# Altium footprint library USB.PcbLib: 23 footprints (part 1 of 2)
Each footprint in its own frame and in the unit in brackets; x right, y up, seen from the top. Pads: shape width x height; smd on the part's side, far side on the other; paste and mask are expansions set on the pad; w line width, h text height; cw(c..) or ccw(c..) is an arc to the next point about the centre after c.
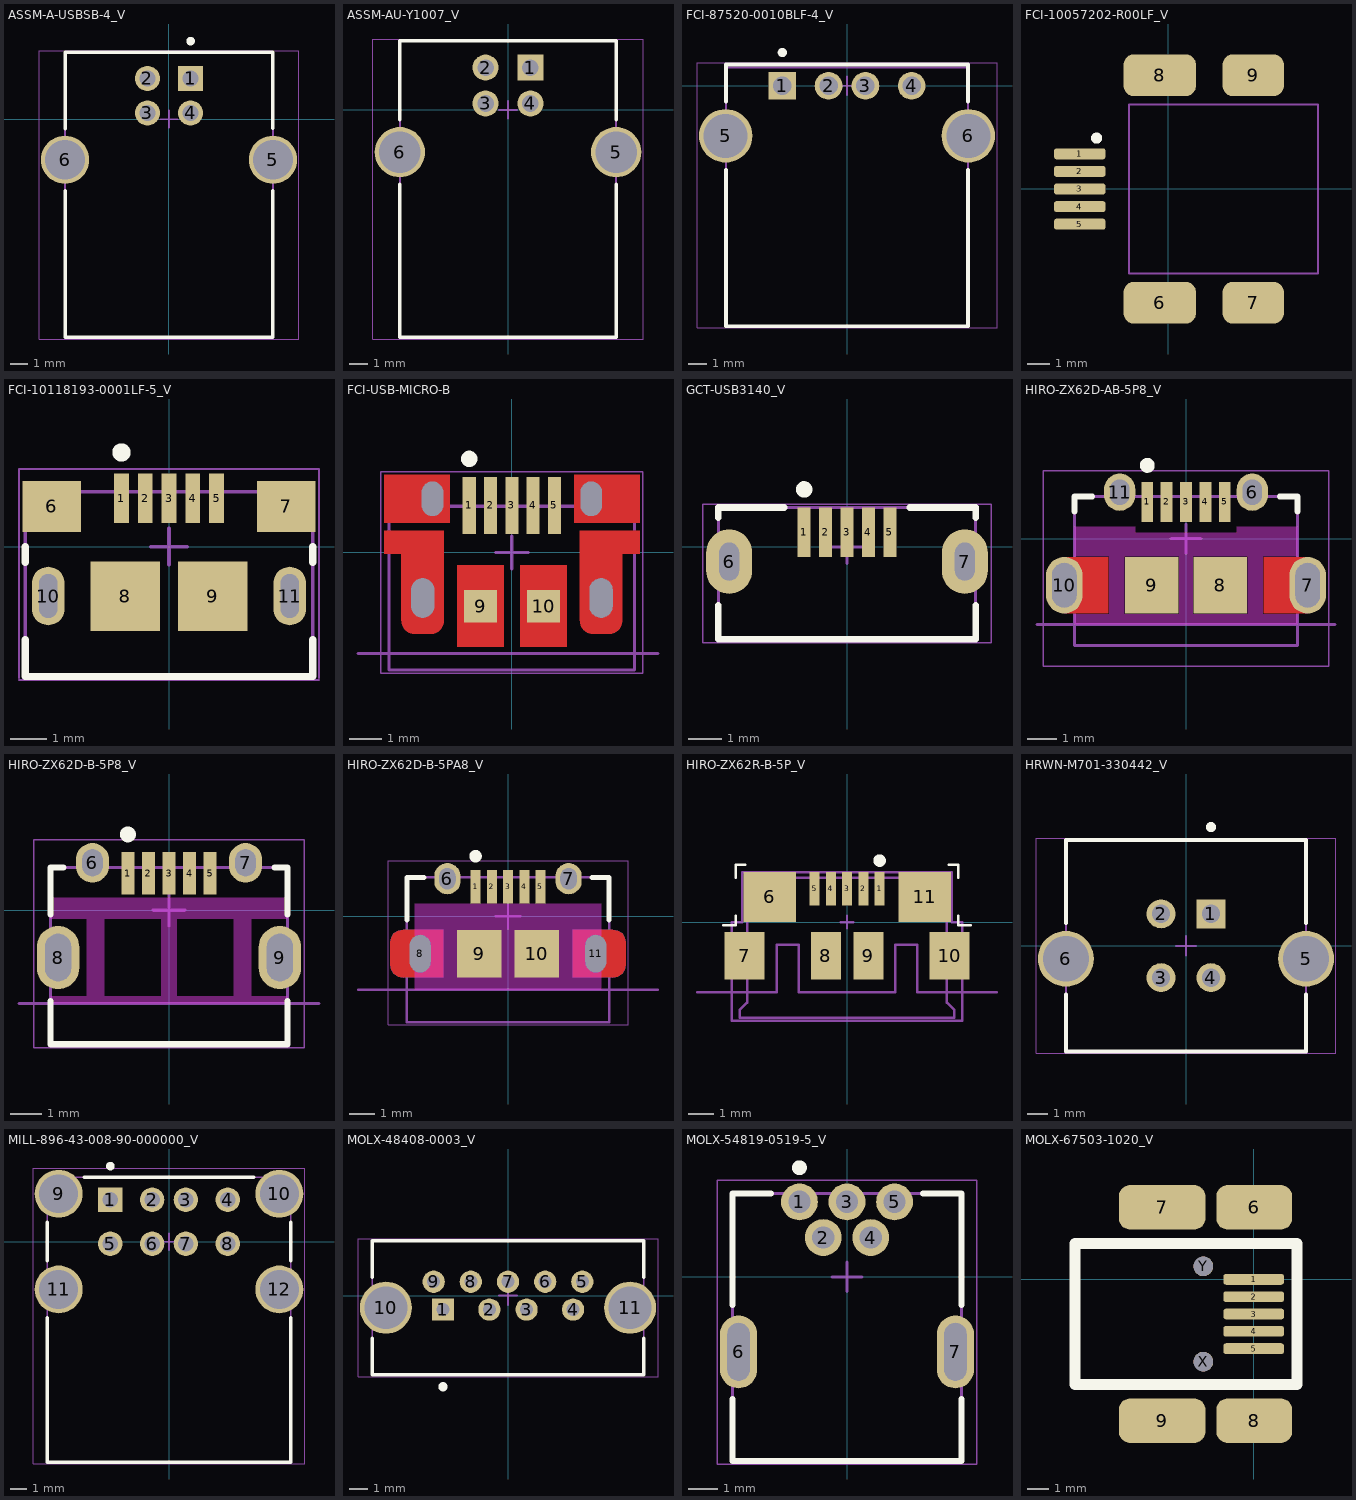
[diagram p0: the footprints below, top view; thin cyan lines are the x and y axes]

## ASSM-A-USBSB-4_V [mm] "USB-B, 4-Leads, Body 16.5x12.04mm"
height 11.05
pads (6):
  rect 1.45x1.45 hole 0.92: 1(1.25,2.355)
  round 1.45 hole 0.92: 2(-1.25,2.355) 3(-1.25,0.355) 4(1.25,0.355)
  round 2.8 hole 2.3: 5(6.02,-2.355) 6(-6.02,-2.355)
Top Overlay:
  circle w0.25: c1.25,4.515 r0.125
  lines w0.2: -6.02,-4.155 -6.02,-12.635 6.02,-12.635 6.02,-4.155 ; -6.02,-0.555 -6.02,3.865 6.02,3.865 6.02,-0.535
Mechanical 13:
  lines w0.1: -6.02,-12.635 6.02,-12.635 6.02,3.865 -6.02,3.865 -6.02,-12.635
Mechanical 15:
  lines w0.05: -7.52,-12.735 -7.52,3.965 7.52,3.965 7.52,-12.735 -7.52,-12.735
  lines w0.1: -0.5,0 0.5,0 ; 0,-0.5 0,0.5
3D body: height 11.05, standoff 0, extent -6.02,-12.635 6.02,3.865

## ASSM-AU-Y1007_V [mm] "USB Connector, 4-Leads, Body 16.5x12.04mm"
height 10.9
pads (6):
  rect 1.45x1.45 hole 0.92: 1(1.25,2.355)
  round 1.45 hole 0.92: 2(-1.25,2.355) 3(-1.25,0.355) 4(1.25,0.355)
  round 2.8 hole 2.3: 5(6.02,-2.355) 6(-6.02,-2.355)
Top Overlay:
  lines w0.2: -6.02,-4.155 -6.02,-12.655 6.02,-12.655 6.02,-4.155 ; -6.02,-0.555 -6.02,3.845 6.02,3.845 6.02,-0.555
Mechanical 13:
  lines w0.1: -6.02,-12.655 -6.02,3.845 6.02,3.845 6.02,-12.655 -6.02,-12.655
Mechanical 15:
  lines w0.05: -7.52,-12.755 7.52,-12.755 7.52,3.945 -7.52,3.945 -7.52,-12.755
  lines w0.1: -0.5,0 0.5,0 ; 0,-0.5 0,0.5
3D body: height 11.7, standoff -3.72, extent -7.195,-12.625 7.195,3.075

## FCI-87520-0010BLF-4_V [mm] "USB-A, 4-Leads, Body 14x13.1mm"
height 7
pads (6):
  rect 1.5x1.5 hole 1: 1(-3.5,0)
  round 1.5 hole 1: 2(-1,0) 3(1,0) 4(3.5,0)
  round 2.9 hole 2.38: 5(-6.57,-2.71) 6(6.57,-2.71)
Top Overlay:
  circle w0.25: c-3.5,1.8 r0.125
  lines w0.2: -6.55,-4.56 -6.55,-13.01 6.55,-13.01 6.55,-4.56 ; -6.55,-0.86 -6.55,1.15 6.55,1.15 6.55,-0.86
Mechanical 13:
  lines w0.1: -6.55,-13.01 -6.55,0.99 6.55,0.99 6.55,-13.01 -6.55,-13.01
Mechanical 15:
  lines w0.05: -8.12,-13.1 -8.12,1.25 8.12,1.25 8.12,-13.1 -8.12,-13.1
  lines w0.1: -0.5,0 0.5,0 ; 0,-0.5 0,0.5
3D body: height 7, standoff 0, extent -6.55,-13.01 6.55,0.99

## FCI-10057202-R00LF_V [mm] "Connector, USB Mini-B, Sinking Type, SMT, 5 Position, Right Angle"
height 0.35
pads (9):
  rrect50% 2.35x0.5 smd paste+0.038 mask+0.038: 1(-4.03,1.6) 2(-4.03,0.8) 3(-4.03,0)
  rrect50% 2.35x0.5 smd paste+0.038 mask+0: 4(-4.03,-0.8) 5(-4.03,-1.6)
  rrect50% 3.302x1.905 smd paste+0.038 mask+0: 6(-0.387,-5.175) 8(-0.387,5.175)
  rrect50% 2.794x1.905 smd paste+0.038 mask+0: 7(3.863,-5.175) 9(3.863,5.175)
Top Overlay:
  circle w0.25: c-3.263,2.314 r0.125
Mechanical 13:
  lines w0.1: -1.788,-3.85 -1.788,3.85 6.813,3.85 6.813,-3.85 -1.788,-3.85
3D body: height 1.41, standoff -2.35, extent -4.212,-5.9 6.858,5.9

## FCI-10118193-0001LF-5_V [mm] "Micro, USB-B, 5-Leads, Body 7.86x5.05mm, Pitch 0.65 mm"
pads (11):
  rect 0.4x1.35 smd: 1(-1.3,1.325) 2(-0.65,1.325) 3(0,1.325) 4(0.65,1.325) 5(1.3,1.325)
  rect 1.6x1.4 smd: 6(-3.2,1.1) 7(3.2,1.1)
  rect 1.9x1.9 smd: 8(-1.2,-1.35) 9(1.2,-1.35)
  oval 0.9x1.6 hole 0.5 slot 1.2 at 90 deg: 10(-3.3,-1.35) 11(3.3,-1.35)
Top Overlay:
  circle w0.25: c-1.3,2.575 r0.125
  lines w0.2: -3.93,-2.537 -3.93,-3.55 3.93,-3.55 3.93,-2.537 ; -3.93,-0.428 -3.93,0 ; 3.93,-0.428 3.93,0
Mechanical 13:
  lines w0.1: -3.93,-3.55 -3.93,1.5 3.93,1.5 3.93,-3.55 -3.93,-3.55
Mechanical 15:
  lines w0.05: -4.1,-3.65 4.1,-3.65 ; -4.1,-3.6 -4.1,2.125 4.1,2.125 4.1,-3.6
  lines w0.1: -0.5,0 0.5,0 ; 0,-0.5 0,0.5
3D body: height 2.83, standoff -0.77, extent -3.928,-4.16 3.929,1.5

## FCI-USB-MICRO-B [mm] "USB, MICRO B, Pitch 0.65 mm"
height 2.673
pads (11):
  rect 0.4x1.75 smd: 1(-1.3,1.435) 2(-0.65,1.435) 3(0,1.435) 4(0.65,1.435) 5(1.3,1.435)
  round 0 hole 0.65 slot 1.05 at 90 deg: 6(-2.425,1.64) 7(2.425,1.64)
  rrect50% 0x0 hole 0.7 slot 1.2 at 90 deg: 8(-2.725,-1.39) 11(2.725,-1.39)
  rect 1x1 smd: 9(-0.957,-1.64) 10(0.968,-1.64)
Top Layer:
  circle w0.4: c2.975,-2.09 r0.2
  circle w0.4: c2.475,-2.09 r0.2
  circle w0.4: c-2.975,-2.09 r0.2
  circle w0.4: c-2.475,-2.09 r0.2
  rectangle: 2.475,-2.49 2.975,-2.09
  rectangle: 0.255,-2.89 1.68,-0.39
  rectangle: -1.67,-2.89 -0.245,-0.39
  rectangle: -2.975,-2.09 -2.475,-2.09
  rectangle: -2.975,-2.49 -2.475,-2.09
  region: 1.9,2.37 3.9,2.37 3.9,0.91 1.9,0.91
  region: -3.375,-2.09 -3.375,-0.04 -3.9,-0.04 -3.9,0.66 -2.075,0.66 -2.075,-2.09
  region: 2.075,-2.09 2.075,0.66 3.9,0.66 3.9,-0.04 3.375,-0.04 3.375,-2.09
  region: -3.9,2.37 -1.9,2.37 -1.9,0.91 -3.9,0.91
Top Overlay:
  circle w0.25: c-1.3,2.86 r0.125
Mechanical 6:
  lines w0.1: -4.7,-3.09 4.465,-3.09
  text "PCB EDGE" at -7.225,-3.14 h0.3
Mechanical 13:
  lines w0.1: -3.75,-3.59 -3.75,1.41 3.75,1.41 3.75,-3.59 -3.75,-3.59
Mechanical 15:
  lines w0.05: -4,-3.69 -4,2.47 4,2.47 4,-3.69 -4,-3.69
  lines w0.1: -0.5,0 0.5,0 ; 0,-0.5 0,0.5
3D body: height 2.99, standoff 0, extent -3.75,-3.59 3.75,1.41

## GCT-USB3140_V [mm] "USB, Micro B, Body 7.8x4mm, Pitch 0.65mm"
height 6.5
pads (7):
  rect 0.4x1.5 smd: 1(-1.3,0.445) 2(-0.65,0.445) 3(0,0.445) 4(0.65,0.445) 5(1.3,0.445)
  oval 1.4x1.95 hole 0.6 slot 1.15 at 90 deg: 6(-3.575,-0.445) 7(3.575,-0.445)
Top Overlay:
  circle w0.25: c-1.3,1.745 r0.125
  lines w0.2: -3.9,-1.771 -3.9,-2.805 3.9,-2.805 3.9,-1.771 ; -3.9,0.881 -3.9,1.195 -1.9,1.195 ; 1.9,1.195 3.9,1.195 3.9,0.881
Mechanical 13:
  lines w0.1: -3.9,-2.805 -3.9,1.195 3.9,1.195 3.9,-2.805 -3.9,-2.805
Mechanical 15:
  lines w0.05: -4.375,-2.905 4.375,-2.905 4.375,1.295 -4.375,1.295 -4.375,-2.905
  lines w0.1: -0.5,0 0.5,0 ; 0,-0.5 0,0.5
3D body: height 6.55, standoff -2.25, extent -3.9,-2.805 3.902,1.195

## HIRO-ZX62D-AB-5P8_V [mm] "USB Micro-AB Connector, 5-Leads, Pitch 0.65mm"
height 2.8
pads (11):
  rect 0.4x1.35 smd: 1(-1.3,1.238) 2(-0.65,1.238) 3(0,1.238) 4(0.65,1.238) 5(1.3,1.238)
  oval 1.05x1.25 hole 0.65 slot 0.85 at 90 deg: 6(2.225,1.563) 11(-2.225,1.563)
  oval 1.225x1.9 hole 0.825 slot 1.5 at 90 deg: 7(4.088,-1.562) 10(-4.088,-1.562)
  rect 1.8x1.9 smd: 8(1.15,-1.562) 9(-1.15,-1.562)
Top Layer:
  rectangle: 2.6,-2.512 4.088,-0.612
  rectangle: -4.088,-2.512 -2.6,-0.612
Top Layer keep-out:
  rectangle: -3.75,-0.602 -1.7,0.413
  rectangle: -1.7,-0.602 1.7,0.213
  rectangle: 1.7,-0.602 3.75,0.413
  rectangle: -3.75,-2.887 3.75,-2.522
  rectangle: -2.59,-2.522 -2.06,-0.602
  rectangle: -0.24,-2.522 0.24,-0.602
  region: 2.59,-0.602 2.06,-0.602 2.06,-2.522 2.59,-2.522
Top Overlay:
  circle w0.25: c-1.3,2.463 r0.125
  lines w0.2: -3.75,0.91 -3.75,1.412 -3.149,1.412 ; 3.149,1.412 3.75,1.412 3.75,0.91
Mechanical 3:
  lines w0.1: -5,-2.887 5,-2.887
  text "board edge" at -7.112,-2.921 h0.2
Mechanical 13:
  lines w0.1: -3.75,-3.588 3.75,-3.587 3.75,1.413 -3.75,1.413 -3.75,-3.588
Mechanical 15:
  lines w0.05: -4.8,2.288 4.8,2.288 4.8,-4.286 -4.8,-4.286 -4.8,2.288
  lines w0.1: -0.5,0 0.5,0 ; 0,-0.5 0,0.5
3D body: height 2.5, standoff 2.25, extent -0.967,1.262 0.972,1.862
3D body: height 2.25, standoff -0.85, extent -2.379,1.262 2.387,1.863
3D body: height 0.25, standoff 0, extent -0.8,0.542 -0.493,1.685
3D body: height 0.25, standoff 0, extent -1.45,0.542 -1.143,1.685
3D body: height 0.25, standoff 0, extent 1.15,0.542 1.457,1.685
3D body: height 0.25, standoff 0, extent 0.5,0.542 0.807,1.685
3D body: height 0.25, standoff 0, extent -0.15,0.542 0.157,1.685
3D body: height 2.51, standoff -0.01, extent -3.756,-3.587 3.757,0.213
3D body: height 0.55, standoff -0.6, extent -4.373,-1.916 -3.603,-1.066
3D body: height 0.55, standoff -0.6, extent 3.603,-1.916 4.373,-1.065
3D body: height 2.5, standoff -0.01, extent -3.754,0.213 3.757,1.413
3D body: height 0.25, standoff 0, extent -3.25,0.212 3.25,0.543
3D body: height 1.79, standoff 0.71, extent -4,-4.187 -3.5,-3.586
3D body: height 1.79, standoff 0.71, extent 3.5,-4.187 4,-3.586
3D body: height 0.25, standoff -0.32, extent -3.05,-4.186 3.05,-3.586
3D body: height 2.83, standoff 2.25, extent -3.05,-4.186 3.05,-3.586

## HIRO-ZX62D-B-5P8_V [mm] "Micro-USB Connector, 9-Leads, Body 7.5x5.6mm, Pitch 0.65mm"
height 2.65
pads (9):
  rect 0.4x1.35 smd: 1(-1.3,1.175) 2(-0.65,1.175) 3(0,1.175) 4(0.65,1.175) 5(1.3,1.175)
  oval 1.05x1.25 hole 0.65 slot 0.85 at 90 deg: 6(-2.425,1.5) 7(2.425,1.5)
  oval 1.35x2 hole 0.825 slot 1.5 at 90 deg: 8(-3.512,-1.5) 9(3.512,-1.5)
Top Layer keep-out:
  region: 2.55,-2 2.1,-2 2.1,-1 2.55,-1
  region: -2.55,-2 -2.1,-2 -2.1,-1 -2.55,-1
  region: -0.18,-1.8 -0.18,-1 0.18,-1 0.18,-1.8
  region: -3.75,-2.725 -2.6,-2.725 -2.6,-1.5 -2.05,-1.5 -2.05,-2.725 -0.25,-2.725 -0.25,-1.5 0.25,-1.5 0.25,-2.725 2.05,-2.725 2.05,-1.5 2.6,-1.5 2.6,-2.725 3.75,-2.725 3.75,-2.95 -3.75,-2.95
  region: -2.6,-1.5 -2.05,-1.5 -2.05,-0.275 -0.25,-0.275 -0.25,-1.5 0.25,-1.5 0.25,-0.275 2.05,-0.275 2.05,-1.5 2.6,-1.5 2.6,-0.275 3.75,-0.275 3.75,0.395 -3.75,0.395 -3.75,-0.275 -2.6,-0.275
Top Overlay:
  circle w0.25: c-1.3,2.4 r0.125
  lines w0.2: -3.75,-2.873 -3.75,-4.25 3.75,-4.25 3.75,-2.873 ; -3.75,-0.127 -3.75,1.35 -3.349,1.35 ; 3.349,1.35 3.75,1.35 3.75,-0.127
Mechanical 1:
  lines w0.1: -4.75,-2.95 4.75,-2.95
  text "Board Edge" at -1.568,-3.405 h0.3
Mechanical 13:
  lines w0.1: -3.75,-4.25 3.75,-4.25 3.75,-2.95 3.75,1.35 -3.75,1.35 -3.75,-2.95 -3.75,-4.25
Mechanical 15:
  lines w0.05: -4.287,-4.35 4.287,-4.35 4.287,2.225 -4.287,2.225 -4.287,-4.35
  lines w0.1: -0.5,0 0.5,0 ; 0,-0.5 0,0.5
3D body: height 2.75, standoff -0.75, extent -4.047,-4.149 4.047,1.651

## HIRO-ZX62D-B-5PA8_V [mm] "SMD, 5-Leads, Body 7.5x5mm, Pitch 0.65mm"
height 2.8
pads (11):
  rect 0.4x1.35 smd: 1(-1.3,1.175) 2(-0.65,1.175) 3(0,1.175) 4(0.65,1.175) 5(1.3,1.175)
  oval 1.05x1.25 hole 0.65 slot 0.85 at 90 deg: 6(-2.425,1.5) 7(2.425,1.5)
  oval 0.525x1.2 hole 0.825 slot 1.5 at 90 deg: 8(-3.512,-1.5) 11(3.512,-1.5)
  rect 1.8x1.9 smd: 9(-1.15,-1.5) 10(1.15,-1.5)
Top Layer:
  region: -4.2,-2.46 -4.395,-2.421 -4.56,-2.31 -4.671,-2.145 -4.71,-1.95 -4.7,-1.95 -4.71,-1.05 -4.671,-0.855 -4.56,-0.69 -4.395,-0.579 -4.2,-0.54 -4.2,-0.55 -2.6,-0.55 -2.6,-2.45
  region: 4.2,-2.46 4.395,-2.421 4.56,-2.31 4.671,-2.145 4.71,-1.95 4.7,-1.95 4.71,-1.05 4.671,-0.855 4.56,-0.69 4.395,-0.579 4.2,-0.54 4.2,-0.55 2.6,-0.55 2.6,-2.45
Top Layer keep-out:
  rectangle: -3.75,-2.95 3.75,0.5
Bottom Layer:
  region: -4.2,-2.46 -4.395,-2.421 -4.56,-2.31 -4.671,-2.145 -4.71,-1.95 -4.7,-1.95 -4.71,-1.05 -4.671,-0.855 -4.56,-0.69 -4.395,-0.579 -4.2,-0.54 -4.2,-0.55 -2.6,-0.55 -2.6,-2.45
  region: 4.2,-2.46 4.395,-2.421 4.56,-2.31 4.671,-2.145 4.71,-1.95 4.7,-1.95 4.71,-1.05 4.671,-0.855 4.56,-0.69 4.395,-0.579 4.2,-0.54 4.2,-0.55 2.6,-0.55 2.6,-2.45
Top Overlay:
  circle w0.25: c-1.3,2.4 r0.125
  lines w0.2: -4.047,-0.15 -4.047,1.55 -3.35,1.55 ; 3.35,1.55 4.047,1.55 4.047,-0.15
Top Paste:
  region: 2.96,1.4 2.92,1.195 2.804,1.021 2.63,0.905 2.425,0.865 2.22,0.905 2.046,1.021 1.93,1.195 1.89,1.4 1.9,1.4 1.89,1.6 1.93,1.805 2.046,1.979 2.22,2.095 2.425,2.135 2.63,2.095 2.804,1.979 2.92,1.805 2.96,1.6 2.95,1.6
  region: -2.96,1.4 -2.92,1.195 -2.804,1.021 -2.63,0.905 -2.425,0.865 -2.22,0.905 -2.046,1.021 -1.93,1.195 -1.89,1.4 -1.9,1.4 -1.89,1.6 -1.93,1.805 -2.046,1.979 -2.22,2.095 -2.425,2.135 -2.63,2.095 -2.804,1.979 -2.92,1.805 -2.96,1.6 -2.95,1.6
Mechanical 1:
  lines w0.1: -6,-2.95 -5.4,-2.95 -5.1,-2.95 -5,-2.95 6,-2.95
  text "PCB EDGE" at 5.8,-2.4 h1
Mechanical 13:
  lines w0.1: -4.047,-4.25 -4.047,1.55 4.047,1.55 4.047,-4.25 -4.047,-4.25
Mechanical 15:
  lines w0.05: -4.8,-4.35 4.8,-4.35 4.8,2.225 -4.8,2.225 -4.8,-4.35
  lines w0.1: -0.5,0 0.5,0 ; 0,-0.5 0,0.5
3D body: height 2.75, standoff -0.7, extent -4.047,-4.25 4.047,1.55

## HIRO-ZX62R-B-5P_V [mm] "USB Micro-B R/A Connector"
height 2.65
pads (11):
  rect 0.4x1.35 smd: 1(1.3,1.338) 2(0.65,1.338) 3(0,1.338) 4(-0.65,1.338) 5(-1.3,1.338)
  rect 2.1x2 smd: 6(-3.1,1.012) 11(3.1,1.012)
  rect 1.6x1.9 smd: 7(-4.1,-1.338) 10(4.1,-1.338)
  rect 1.2x1.9 smd: 8(-0.85,-1.338) 9(0.85,-1.338)
Top Overlay:
  circle w0.25: c1.304,2.46 r0.125
  lines w0.1: -4.953,-0.127 -4.445,-0.127 -4.445,0.254 ; -4.445,1.778 -4.445,2.286 -4.064,2.286 ; 4.064,2.286 4.445,2.286 4.445,1.778 ; 4.445,0.254 4.445,-0.127 4.953,-0.127
Mechanical 1:
  lines w0.1: -6,-2.8 -2.82,-2.8 -2.82,-0.9 -1.92,-0.9 -1.92,-2.8 0,-2.8 1.92,-2.8 1.92,-0.9 2.82,-0.9 2.82,-2.8 6,-2.8
  text "Board edge" at 5.588,-2.667 h0.2
Mechanical 13:
  lines w0.1: -4,1.78 -4,-0.72 -4.572,-0.72 -4.572,-1.778 -4,-1.778 -4,-3.22 -4.3,-3.52 -4.3,-3.82 4.3,-3.82 4.3,-3.52 4,-3.22 4,-1.778 4.572,-1.778 4.572,-0.72 4,-0.72 4,1.78 ; -4,1.78 4,1.78 ; -4,1.78 4,1.78
Mechanical 15:
  lines w0.1: -0.254,0 0.254,0 ; 0,-0.254 0,0.254 ; -4.6,-3.937 -4.6,-2.8 -4.6,0 -4.2,0 -4.2,2 4.2,2 4.2,0 4.6,0 4.6,-2.8 4.6,-3.937 -4.6,-3.937
3D body: height 2.71, standoff -0.23, extent -4.4,-3.953 4.4,1.778

## HRWN-M701-330442_V [mm] "USB, 4-Leads, Body 12.04x10.6mm, Pitch 2.5mm"
height 16.25
pads (6):
  rect 1.45x1.45 hole 0.92: 1(1.25,1.6)
  round 1.45 hole 0.92: 2(-1.25,1.6) 3(-1.25,-1.6) 4(1.25,-1.6)
  round 2.8 hole 2.3: 5(6.02,-0.65) 6(-6.02,-0.65)
Top Overlay:
  circle w0.25: c1.25,5.952 r0.127
  lines w0.2: -6.02,-2.45 -6.02,-5.3 6.02,-5.3 6.02,-2.45 ; -6.02,1.15 -6.02,5.3 6.02,5.3 6.02,1.15
Mechanical 13:
  lines w0.1: -6.02,-5.3 -6.02,5.3 6.02,5.3 6.02,-5.3 -6.02,-5.3
Mechanical 15:
  lines w0.05: -7.52,-5.4 -7.52,5.4 7.52,5.4 7.52,-5.4 -7.52,-5.4
  lines w0.1: -0.5,0 0.5,0 ; 0,-0.5 0,0.5
3D body: height 16.5, standoff -5.1, extent -7.33,-5.715 7.33,4.985

## MILL-896-43-008-90-000000_V [mil] "USB, 8-Leads, Body 16.967x14.503mm"
height 610
pads (12):
  rect 57.09x57.09 hole 36: 1(-137.5,98)
  round 57.09 hole 36: 2(-39.5,98) 3(39.5,98) 4(137.5,98) 5(-137.5,-5) 6(-39.5,-5) 7(39.5,-5) 8(137.5,-5)
  round 112.2 hole 91: 9(-258.5,112) 10(258.5,112) 11(-258.5,-112) 12(258.5,-112)
Top Overlay:
  circle w10: c-137.5,176.74 r5
  lines w7.87: -285.5,-178.57 -285.5,-517 285.5,-517 285.5,-178.57 ; -285.5,-45.43 -285.5,45.43 ; -198.15,151 198.15,151 ; 285.5,-45.43 285.5,45.43
Mechanical 13:
  lines w3.94: -285.5,-517 -285.5,151 285.5,151 285.5,-517 -285.5,-517
Mechanical 15:
  lines w1.97: -318.54,-520.94 318.54,-520.94 318.54,172.05 -318.54,172.05 -318.54,-520.94
  lines w3.94: -19.68,0 19.68,0 ; 0,-19.68 0,19.68
3D body: height 610, standoff 0, extent -285.5,-517 285.5,151

## MOLX-48408-0003_V [mm] "USB 3.0 I/O Receptacle, 9-Leads, Vertical, Height 15.25 mm, Through Hole"
height 15.25
pads (11):
  rect 1.2x1.2 hole 0.7: 1(-3.5,-0.75)
  round 1.2 hole 0.7: 2(-1,-0.75) 3(1,-0.75) 4(3.5,-0.75) 5(4,0.75) 6(2,0.75) 7(0,0.75) 8(-2,0.75) 9(-4,0.75)
  round 2.8 hole 2.3 unplated: 10(-6.57,-0.65) 11(6.57,-0.65)
Top Overlay:
  circle w0.25: c-3.5,-4.9 r0.125
  lines w0.2: -7.3,-2.295 -7.3,-4.25 7.3,-4.25 7.3,-2.295 ; -7.3,0.995 -7.3,2.95 7.3,2.95 7.3,0.995
Mechanical 13:
  lines w0.1: -7.3,-4.25 -7.3,2.95 7.3,2.95 7.3,-4.25 -7.3,-4.25
Mechanical 15:
  lines w0.05: -8.07,-4.35 8.07,-4.35 8.07,3.05 -8.07,3.05 -8.07,-4.35
  lines w0.1: -0.5,0 0.5,0 ; 0,-0.5 0,0.5
3D body: height 15, standoff -3.8, extent -7.798,-4.11 7.798,2.81

## MOLX-54819-0519-5_V [mm] "MINI USB, 5-Leads, Body 9x7.7mm, Pitch 0.8mm"
height 3.95
pads (7):
  round 1.24 hole 0.75: 1(-1.6,2.525) 2(-0.8,1.325) 3(0,2.525) 4(0.8,1.325) 5(1.6,2.525)
  oval 1.25x2.45 hole 0.75 slot 1.95 at 90 deg: 6(-3.65,-2.525) 7(3.65,-2.525)
Top Overlay:
  circle w0.25: c-1.6,3.675 r0.125
  lines w0.2: -3.85,-4.105 -3.85,-6.2 3.85,-6.2 3.85,-4.105 ; -3.85,-0.945 -3.85,2.8 -2.562,2.8 ; 2.562,2.8 3.85,2.8 3.85,-0.945
Mechanical 13:
  lines w0.1: -3.85,-6.2 3.85,-6.2 3.85,2.8 -3.85,2.8 -3.85,-6.2
Mechanical 15:
  lines w0.05: -4.375,-6.3 4.375,-6.3 4.375,3.245 -4.375,3.245 -4.375,-6.3
  lines w0.1: -0.5,0 0.5,0 ; 0,-0.5 0,0.5
3D body: height 4.05, standoff -1.7, extent -3.85,-6.2 3.85,2.8

## MOLX-67503-1020_V [mm] "Mini USB Connector, SMT, Righer Angle"
pads (11):
  rrect50% 2.8x0.5 smd: 1(0,0) 2(0,-0.8) 3(0,-1.6) 4(0,-2.4) 5(0,-3.2)
  rrect50% 3.5x2.05 smd: 6(0.025,3.325) 8(0.025,-6.525)
  rrect50% 4x2.05 smd: 7(-4.225,3.325) 9(-4.225,-6.525)
  round 0.9 hole 0.9 unplated: X(-2.325,-3.8) Y(-2.325,0.6)
Top Overlay:
  lines w0.5: -8.25,-4.85 2,-4.85 2,1.65 -8.25,1.65 -8.25,-4.85
3D body: height 3.95, standoff -1, extent -8.217,-6.557 0.783,3.343